# Altium footprint library HamedLib.PcbLib: 221 footprints (part 8 of 14)
Each footprint in its own frame and in the unit in brackets; x right, y up, seen from the top. Pads: shape width x height; smd on the part's side, far side on the other; paste and mask are expansions set on the pad; w line width, h text height; cw(c..) or ccw(c..) is an arc to the next point about the centre after c.
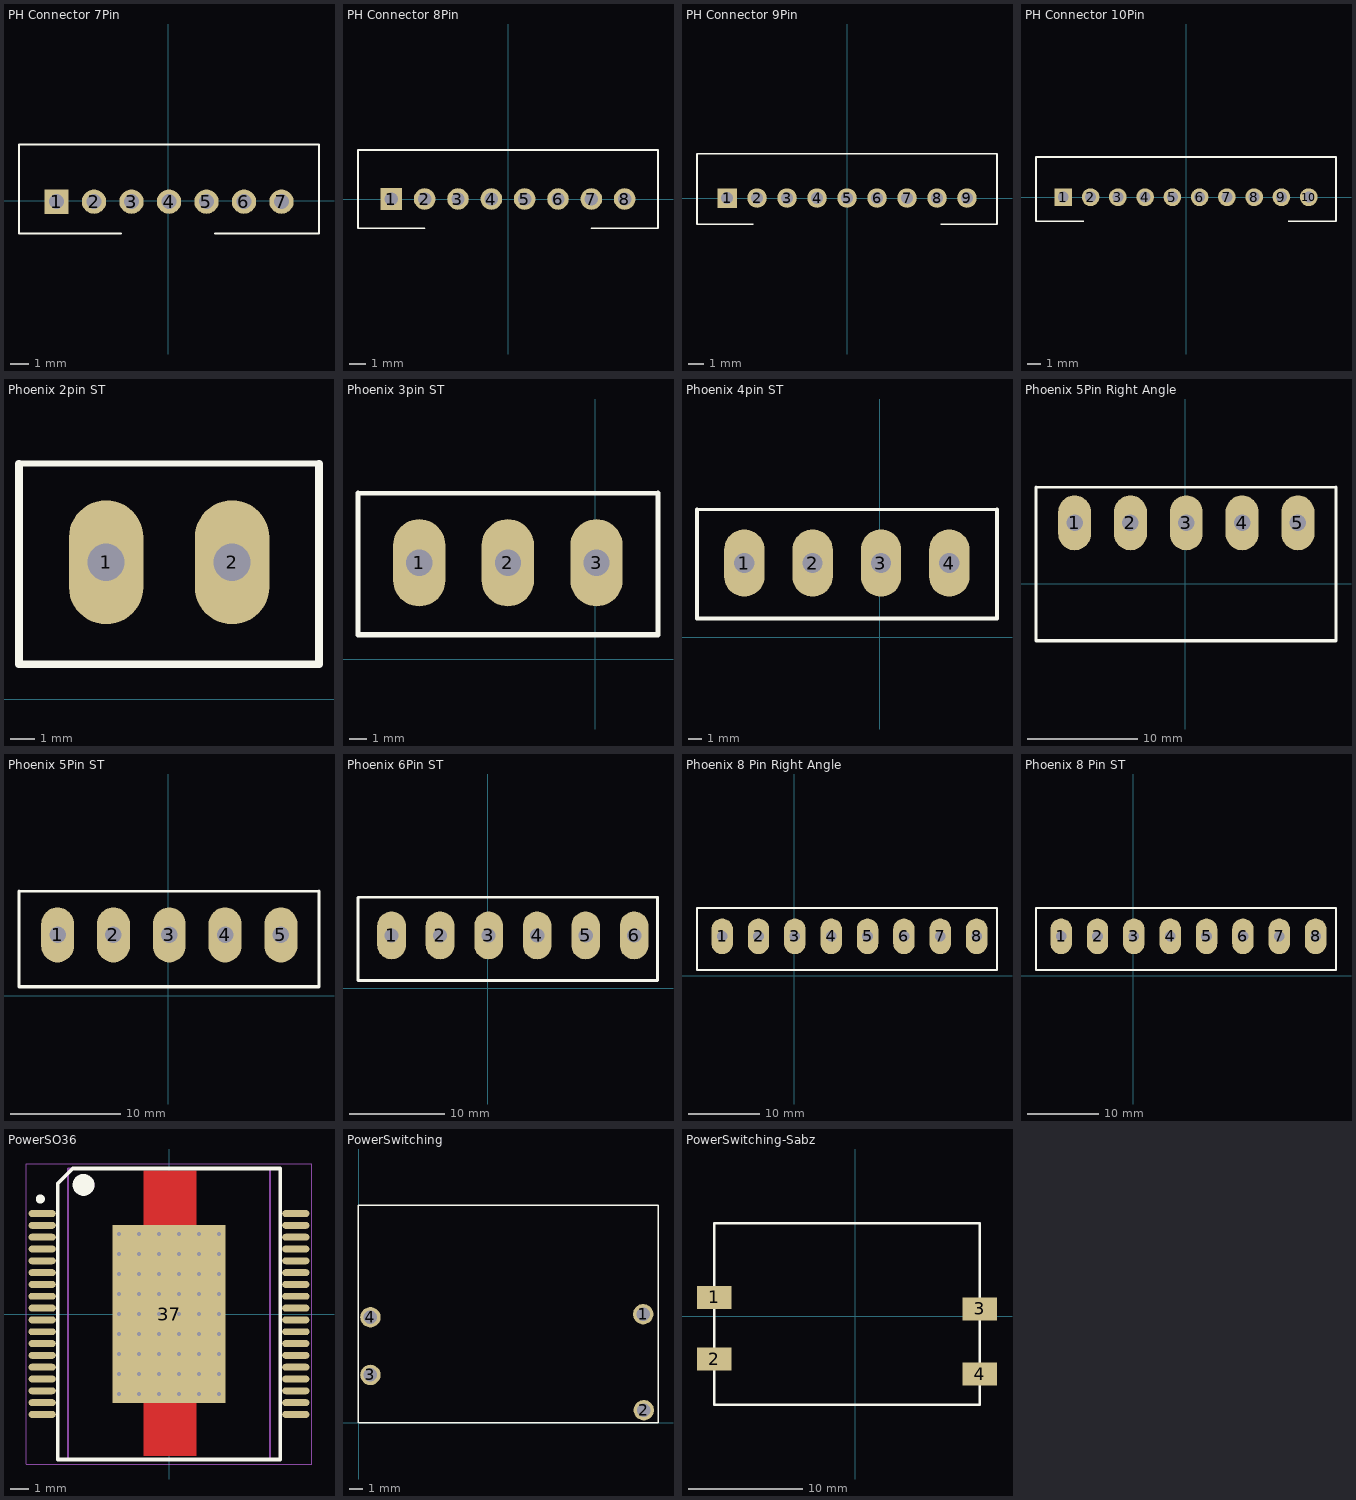
[diagram p7: the footprints below, top view; thin cyan lines are the x and y axes]

## PH Connector 7Pin [mm]
pads (7):
  rect 1.3x1.3 hole 0.8: 1(-5.95,-0.05)
  round 1.3 hole 0.8: 2(-3.95,-0.05) 3(-1.95,-0.05) 4(0.05,-0.05) 5(2.05,-0.05) 6(4.05,-0.05) 7(6.05,-0.05)
Top Overlay:
  lines w0.1: -7.95,-1.75 -2.5,-1.75 ; 2.5,-1.75 8.05,-1.75
  lines w0.127: -7.95,-1.75 -7.95,3 8.05,3 8.05,-1.75
3D body "62000711622.stp": height 6.07, standoff -3.37, extent -7.95,-1.675 8.05,2.975

## PH Connector 8Pin [mm] "Male Vertical Shrouded Header - 08p 1 row"
height 6.1
pads (8):
  rect 1.3x1.3 hole 0.8: 1(-7,0)
  round 1.3 hole 0.8: 2(-5,0) 3(-3,0) 4(-1,0) 5(1,0) 6(3,0) 7(5,0) 8(7,0)
Top Overlay:
  lines w0.1: -9,-1.75 -5,-1.75 ; 5,-1.75 9,-1.75
  lines w0.127: -9,-1.75 -9,2.95 9,2.95 9,-1.75
3D body "62000811622.stp": height 6.07, standoff -3.37, extent -9,-1.625 9,3.025

## PH Connector 9Pin [mm] "Male Vertical Shrouded Header - 09p 1 row"
height 6.1
pads (9):
  rect 1.3x1.3 hole 0.8: 1(-8,0)
  round 1.3 hole 0.8: 2(-6,0) 3(-4,0) 4(-2,0) 5(0,0) 6(2,0) 7(4,0) 8(6,0) 9(8,0)
Top Overlay:
  lines w0.1: -10,-1.75 -6.25,-1.75 ; 6.25,-1.75 10,-1.75
  lines w0.127: -10,-1.75 -10,2.95 10,2.95 10,-1.75
3D body "62000911622.stp": height 6.07, standoff -3.37, extent -10,-1.625 10,3.025

## PH Connector 10Pin [mm] "Male Vertical Shrouded Header - 10p 1 row"
height 6.1
pads (10):
  rect 1.3x1.3 hole 0.8: 1(-9,0)
  round 1.3 hole 0.8: 2(-7,0) 3(-5,0) 4(-3,0) 5(-1,0) 6(1,0) 7(3,0) 8(5,0) 9(7,0) 10(9,0)
Top Overlay:
  lines w0.1: -11,-1.75 -7.5,-1.75 ; 7.5,-1.75 11,-1.75
  lines w0.127: -11,-1.75 -11,2.95 11,2.95 11,-1.75
3D body "62001011622.stp": height 6.07, standoff -3.37, extent -11,-1.625 11,3.025

## Phoenix 2pin ST [mm] "-"
pads (2):
  oval 3x5 hole 1.5: 1(-10.086,5.52) 2(-5.006,5.52)
Top Overlay:
  lines w0.254: -13.6,9.5 -1.5,9.5
  lines w0.305: -13.6,9.5 -13.6,1.4 -1.5,1.4 -1.5,9.5
3D body "Phoenix 2pin Straight.stp": height 12, standoff -3.9, extent -13.6,1 -1.6,9.6

## Phoenix 3pin ST [mm] "-"
pads (3):
  oval 3x5 hole 1.5: 1(-10.086,5.52) 2(-5.006,5.52) 3(0.074,5.52)
Top Overlay:
  lines w0.254: -13.6,9.5 3.6,9.5
  lines w0.305: -13.6,9.5 -13.6,1.4 3.6,1.4 3.6,9.5
3D body "Phoenix 3pin Straight.stp": height 12, standoff -3.9, extent -13.6,1 3.4,9.6

## Phoenix 4pin ST [mm] "-"
pads (4):
  oval 3x5 hole 1.5: 1(-10.086,5.52) 2(-5.006,5.52) 3(0.074,5.52) 4(5.154,5.52)
Top Overlay:
  lines w0.254: -13.6,9.5 8.7,9.5
  lines w0.305: -13.6,9.5 -13.6,1.4 8.7,1.4 8.7,9.5
3D body "Phoenix 4pin Straight.stp": height 12, standoff -3.9, extent -13.5,0.9 8.5,9.5

## Phoenix 5Pin Right Angle [mm] "-"
pads (5):
  oval 3x5 hole 1.5: 1(-10.086,5.52) 2(-5.006,5.52) 3(0.074,5.52) 4(5.154,5.52) 5(10.234,5.52)
Top Overlay:
  lines w0.254: -13.6,8.763 13.7,8.763
  lines w0.305: -13.6,8.763 -13.6,-5.207 13.7,-5.207 13.7,8.763
3D body "User Library-MSTB 2,5-5-G-5,08 1759046.STEP": height 8.6, standoff -3.5, extent -12.7,-4.763 12.7,7.239

## Phoenix 5Pin ST [mm] "-"
pads (5):
  oval 3x5 hole 1.5: 1(-10.086,5.52) 2(-5.006,5.52) 3(0.074,5.52) 4(5.154,5.52) 5(10.234,5.52)
Top Overlay:
  lines w0.254: -13.6,9.5 13.7,9.5
  lines w0.305: -13.6,9.5 -13.6,0.8 13.7,0.8 13.7,9.5
3D body "Phoenix 5pin Straight.stp": height 12, standoff -3.9, extent -13.4,0.7 13.6,9.3

## Phoenix 6Pin ST [mm] "-"
pads (6):
  oval 3x5 hole 1.5: 1(-10.086,5.52) 2(-5.006,5.52) 3(0.074,5.52) 4(5.154,5.52) 5(10.234,5.52) 6(15.314,5.52)
Top Overlay:
  lines w0.254: -13.6,9.5 17.78,9.5
  lines w0.305: -13.6,9.5 -13.6,0.8 17.78,0.8 17.78,9.5

## Phoenix 8 Pin Right Angle [mm] "-"
pads (8):
  oval 3x5 hole 1.5: 1(-10.086,5.52) 2(-5.006,5.52) 3(0.074,5.52) 4(5.154,5.52) 5(10.234,5.52) 6(15.314,5.52) 7(20.394,5.52) 8(25.474,5.52)
Top Overlay:
  lines w0.254: -13.6,9.5 28.321,9.5
  lines w0.305: -13.6,9.5 -13.6,0.8 28.321,0.8 28.321,9.5

## Phoenix 8 Pin ST [mm] "-"
pads (8):
  oval 3x5 hole 1.5: 1(-10.086,5.52) 2(-5.006,5.52) 3(0.074,5.52) 4(5.154,5.52) 5(10.234,5.52) 6(15.314,5.52) 7(20.394,5.52) 8(25.474,5.52)
Top Overlay:
  lines w0.254: -13.6,9.5 28.321,9.5
  lines w0.305: -13.6,9.5 -13.6,0.8 28.321,0.8 28.321,9.5

## PowerSO36 [mm] "SOP, 36-Leads, Body 15.90x11.00mm, Pitch 0.65mm, Thermal Pad 9.80x6.20mm, IPC Medium Density"
height 3.6
pads (37):
  oval 1.5x0.38 smd: 1(-6.975,5.525) 2(-6.975,4.875) 3(-6.975,4.225) 4(-6.975,3.575) 5(-6.975,2.925) 6(-6.975,2.275) 7(-6.975,1.625) 8(-6.975,0.975) 9(-6.975,0.325) 10(-6.975,-0.325) 11(-6.975,-0.975) 12(-6.975,-1.625) 13(-6.975,-2.275) 14(-6.975,-2.925) 15(-6.975,-3.575) 16(-6.975,-4.225) 17(-6.975,-4.875) 18(-6.975,-5.525) 19(6.975,-5.525) 20(6.975,-4.875) 21(6.975,-4.225) 22(6.975,-3.575) 23(6.975,-2.925) 24(6.975,-2.275) 25(6.975,-1.625) 26(6.975,-0.975) 27(6.975,-0.325) 28(6.975,0.325) 29(6.975,0.975) 30(6.975,1.625) 31(6.975,2.275) 32(6.975,2.925) 33(6.975,3.575) 34(6.975,4.225) 35(6.975,4.875) 36(6.975,5.525)
  rect 6.2x9.8 smd: 37(0,0)
via 2.75,-4.4 diameter 0.5 hole 0.2
via 1.65,-4.4 diameter 0.5 hole 0.2
via 0.55,-4.4 diameter 0.5 hole 0.2
via -0.55,-4.4 diameter 0.5 hole 0.2
via -1.65,-4.4 diameter 0.5 hole 0.2
via -2.75,-4.4 diameter 0.5 hole 0.2
via 2.75,-3.3 diameter 0.5 hole 0.2
via 1.65,-3.3 diameter 0.5 hole 0.2
via 0.55,-3.3 diameter 0.5 hole 0.2
via -0.55,-3.3 diameter 0.5 hole 0.2
via -1.65,-3.3 diameter 0.5 hole 0.2
via -2.75,-3.3 diameter 0.5 hole 0.2
via 2.75,-2.2 diameter 0.5 hole 0.2
via 1.65,-2.2 diameter 0.5 hole 0.2
via 0.55,-2.2 diameter 0.5 hole 0.2
via -0.55,-2.2 diameter 0.5 hole 0.2
via -1.65,-2.2 diameter 0.5 hole 0.2
via -2.75,-2.2 diameter 0.5 hole 0.2
via 2.75,-1.1 diameter 0.5 hole 0.2
via 1.65,-1.1 diameter 0.5 hole 0.2
via 0.55,-1.1 diameter 0.5 hole 0.2
via -0.55,-1.1 diameter 0.5 hole 0.2
via -1.65,-1.1 diameter 0.5 hole 0.2
via -2.75,-1.1 diameter 0.5 hole 0.2
via 2.75,0 diameter 0.5 hole 0.2
via 1.65,0 diameter 0.5 hole 0.2
via 0.55,0 diameter 0.5 hole 0.2
via -0.55,0 diameter 0.5 hole 0.2
via -1.65,0 diameter 0.5 hole 0.2
via -2.75,0 diameter 0.5 hole 0.2
via 2.75,1.1 diameter 0.5 hole 0.2
via 1.65,1.1 diameter 0.5 hole 0.2
via 0.55,1.1 diameter 0.5 hole 0.2
via -0.55,1.1 diameter 0.5 hole 0.2
via -1.65,1.1 diameter 0.5 hole 0.2
via -2.75,1.1 diameter 0.5 hole 0.2
via 2.75,2.2 diameter 0.5 hole 0.2
via 1.65,2.2 diameter 0.5 hole 0.2
via 0.55,2.2 diameter 0.5 hole 0.2
via -0.55,2.2 diameter 0.5 hole 0.2
via -1.65,2.2 diameter 0.5 hole 0.2
via -2.75,2.2 diameter 0.5 hole 0.2
via 2.75,3.3 diameter 0.5 hole 0.2
via 1.65,3.3 diameter 0.5 hole 0.2
via 0.55,3.3 diameter 0.5 hole 0.2
via -0.55,3.3 diameter 0.5 hole 0.2
via -1.65,3.3 diameter 0.5 hole 0.2
via -2.75,3.3 diameter 0.5 hole 0.2
via 2.75,4.4 diameter 0.5 hole 0.2
via 1.65,4.4 diameter 0.5 hole 0.2
via 0.55,4.4 diameter 0.5 hole 0.2
via -0.55,4.4 diameter 0.5 hole 0.2
via -1.65,4.4 diameter 0.5 hole 0.2
via -2.75,4.4 diameter 0.5 hole 0.2
Top Layer:
  rectangle: -1.4,-7.8 1.5,-4.8
  rectangle: -1.4,4.9 1.5,7.9
Top Overlay:
  circle w0.6: c-4.7,7.1 r0.3
  circle w0.25: c-7.075,6.325 r0.125
  lines w0.2: -6.125,-8 -6.125,7.175 -5.3,8 6.125,8 6.125,-8 -6.125,-8
Mechanical 13:
  circle w0.1: c-4.65,7.1 r0.5
  lines w0.1: -5.55,-8 5.55,-8 5.55,8 -5.55,8 -5.55,-8
Mechanical 15:
  lines w0.05: -7.85,-8.25 7.85,-8.25 7.85,8.25 -7.85,8.25 -7.85,-8.25
  lines w0.1: -0.5,0 0.5,0 ; 0,-0.5 0,0.5
3D body "User Library-PowerSO36.STEP": height 3.6, standoff 0, extent -7.028,-8.025 7.028,7.975

## PowerSwitching [mm]
pads (4):
  round 1.5 hole 1: 1(20.93,8.001) 2(20.98,0.94) 3(0.864,3.531) 4(0.864,7.772)
Top Overlay:
  lines w0.1: -0.025,0 -0.025,16.002 -0.051,16.027 21.996,16.027 22.022,16.002 22.022,0 0,0
3D body "PowerSwitching12v.STEP": height 12.75, standoff 0, extent -0.004,-0.024 21.996,15.976

## PowerSwitching-Sabz [mm]
pads (4):
  rect 3x2 smd: 1(-12.326,1.653) 2(-12.326,-3.747) 3(10.924,0.653) 4(10.924,-5.047)
Top Overlay:
  lines w0.2: -12.326,-7.747 -12.326,8.153 10.924,8.153 10.924,-7.747 -12.326,-7.747
3D body "switching.STEP": height 10.76, standoff 0, extent -12.326,-7.747 10.924,8.153

## PowerVia2*5 [mm]
via -0.25,-0.9 diameter 1.27 hole 0.711
via 3.55,1 diameter 1.27 hole 0.711
via 3.55,-0.9 diameter 1.27 hole 0.711
via 1.65,-0.9 diameter 1.27 hole 0.711
via 1.65,1 diameter 1.27 hole 0.711
via -0.25,1 diameter 1.27 hole 0.711
via -2.15,-0.9 diameter 1.27 hole 0.711
via -2.15,1 diameter 1.27 hole 0.711
via -4.05,1 diameter 1.27 hole 0.711
via -4.05,-0.9 diameter 1.27 hole 0.711